# Altium footprint library Библиотека посадочных мест.PcbLib: 128 footprints (part 2 of 8)
Each footprint in its own frame and in the unit in brackets; x right, y up, seen from the top. Pads: shape width x height; smd on the part's side, far side on the other; paste and mask are expansions set on the pad; w line width, h text height; cw(c..) or ccw(c..) is an arc to the next point about the centre after c.
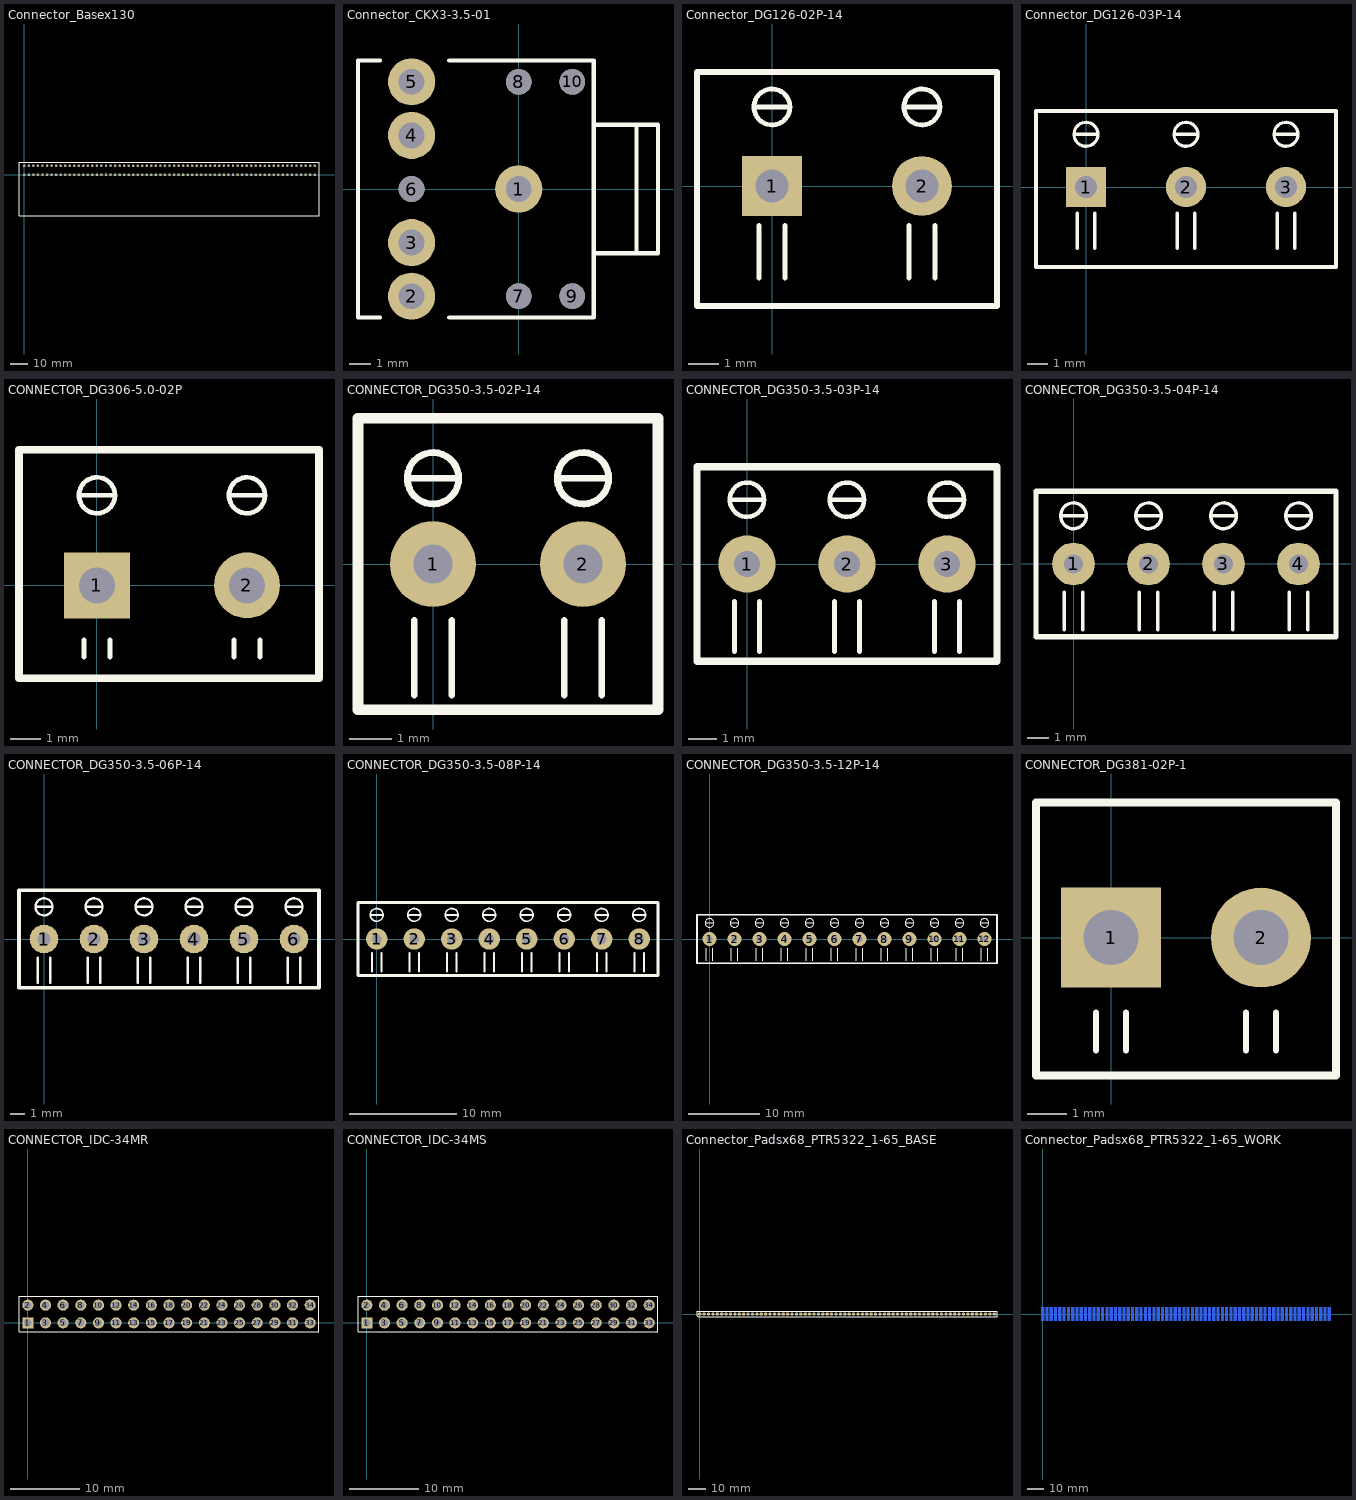
[diagram p1: the footprints below, top view; thin cyan lines are the x and y axes]

## Connector_Basex130 [mm]
pads (130):
  round 1.4 hole 0.9: 1(0,0) 2(2.54,0) 3(5.08,0) 4(7.62,0) 5(10.16,0) 6(12.7,0) 7(15.24,0) 8(17.78,0) 9(20.32,0) 10(22.86,0) 11(25.4,0) 12(27.94,0) 13(30.48,0) 14(33.02,0) 15(35.56,0) 16(38.1,0) 17(40.64,0) 18(43.18,0) 19(45.72,0) 20(48.26,0) 21(50.8,0) 22(53.34,0) 23(55.88,0) 24(58.42,0) 25(60.96,0) 26(63.5,0) 27(66.04,0) 28(68.58,0) 29(71.12,0) 30(73.66,0) 31(76.2,0) 32(78.74,0) 33(81.28,0) 34(83.82,0) 35(86.36,0) 36(88.9,0) 37(91.44,0) 38(93.98,0) 39(96.52,0) 40(99.06,0) 41(101.6,0) 42(104.14,0) 43(106.68,0) 44(109.22,0) 45(111.76,0) 46(114.3,0) 47(116.84,0) 48(119.38,0) 49(121.92,0) 50(124.46,0) 51(127,0) 52(129.54,0) 53(132.08,0) 54(134.62,0) 55(137.16,0) 56(139.7,0) 57(142.24,0) 58(144.78,0) 59(147.32,0) 60(149.86,0) 61(152.4,0) 62(154.94,0) 63(157.48,0) 64(160.02,0) 65(162.56,0) 66(0,5.08) 67(2.54,5.08) 68(5.08,5.08) 69(7.62,5.08) 70(10.16,5.08) 71(12.7,5.08) 72(15.24,5.08) 73(17.78,5.08) 74(20.32,5.08) 75(22.86,5.08) 76(25.4,5.08) 77(27.94,5.08) 78(30.48,5.08) 79(33.02,5.08) 80(35.56,5.08) 81(38.1,5.08) 82(40.64,5.08) 83(43.18,5.08) 84(45.72,5.08) 85(48.26,5.08) 86(50.8,5.08) 87(53.34,5.08) 88(55.88,5.08) 89(58.42,5.08) 90(60.96,5.08) 91(63.5,5.08) 92(66.04,5.08) 93(68.58,5.08) 94(71.12,5.08) 95(73.66,5.08) 96(76.2,5.08) 97(78.74,5.08) 98(81.28,5.08) 99(83.82,5.08) 100(86.36,5.08) 101(88.9,5.08) 102(91.44,5.08) 103(93.98,5.08) 104(96.52,5.08) 105(99.06,5.08) 106(101.6,5.08) 107(104.14,5.08) 108(106.68,5.08) 109(109.22,5.08) 110(111.76,5.08) 111(114.3,5.08) 112(116.84,5.08) 113(119.38,5.08) 114(121.92,5.08) 115(124.46,5.08) 116(127,5.08) 117(129.54,5.08) 118(132.08,5.08) 119(134.62,5.08) 120(137.16,5.08) 121(139.7,5.08) 122(142.24,5.08) 123(144.78,5.08) 124(147.32,5.08) 125(149.86,5.08) 126(152.4,5.08) 127(154.94,5.08) 128(157.48,5.08) 129(160.02,5.08) 130(162.56,5.08)
Top Overlay:
  lines w0.254: -3,-23 165,-23 165,7 82,7 -2,7 -3,7 -3,-23
3D body "Разъем Lab-Volt.STEP": height 11, standoff 0, extent -13.67,-23.203 179.18,10.847

## Connector_CKX3-3.5-01 [mm] "Audio Jack 3.5mm"
pads (10):
  round 2.2 hole 1.2: 1(0,0) 2(-5,-5) 3(-5,-2.5) 4(-5,2.5) 5(-5,5)
  round 1.2 hole 1.2: 6(-5,0) 7(0,-5) 8(0,5) 9(2.5,-5) 10(2.5,5)
Top Overlay:
  lines w0.2: -6.477,-6 -7.5,-6 -7.5,6 -6.477,6 ; -3.238,-6 3.5,-6 3.5,6 -3.238,6 ; 3.5,-3 6.5,-3 6.5,3 3.5,3 ; 5.5,-3 5.5,3
3D body "ST-212.step": height 1.5, standoff -7.3, extent -7.572,-6 6.428,6

## Connector_DG126-02P-14 [mm]
pads (2):
  rect 2x2 hole 1.1: 1(0,0)
  round 2 hole 1.1: 2(5,0)
Top Overlay:
  circle w0.16: c5,2.635 r0.6
  circle w0.16: c0,2.635 r0.6
  lines w0.16: -0.6,2.635 0.6,2.635 ; -0.437,-3.063 -0.437,-1.312 ; 0.437,-3.063 0.437,-1.312 ; 4.4,2.635 5.6,2.635 ; 4.563,-3.063 4.563,-1.312 ; 5.437,-3.063 5.437,-1.312
  lines w0.2: -2.5,-4 7.5,-4 7.5,3.8 -2.5,3.8 -2.5,-4
3D body "User Library-DG126-5_0-02P.STEP": height 10.35, standoff -2.04, extent -2.625,-4 7.625,3.8

## Connector_DG126-03P-14 [mm]
pads (3):
  rect 2x2 hole 1.1: 1(0,0)
  round 2 hole 1.1: 2(5,0) 3(10,0)
Top Overlay:
  circle w0.16: c10,2.635 r0.6
  circle w0.16: c0,2.635 r0.6
  circle w0.16: c5,2.635 r0.6
  lines w0.16: -0.6,2.635 0.6,2.635 ; -0.437,-3.063 -0.437,-1.312 ; 0.437,-3.063 0.437,-1.312 ; 4.4,2.635 5.6,2.635 ; 4.563,-3.063 4.563,-1.312 ; 5.437,-3.063 5.437,-1.312 ; 9.4,2.635 10.6,2.635 ; 9.563,-3.063 9.563,-1.312 ; 10.438,-3.063 10.438,-1.312
  lines w0.2: -2.5,-4 -2.5,3.8 7.5,3.8 12.5,3.8 12.5,-4 -2.5,-4
3D body "User Library-DG126-5_0-03P.STEP": height 10.25, standoff -2.14, extent -2.625,-4 12.625,3.8

## CONNECTOR_DG306-5.0-02P [mm]
height 8.4
pads (2):
  rect 2.2x2.2 hole 1.2: 1(0,0)
  round 2.2 hole 1.2: 2(5,0)
Top Overlay:
  circle w0.16: c0,3 r0.6
  circle w0.16: c5,3 r0.6
  lines w0.16: -0.6,3 0.6,3 ; -0.437,-2.4 -0.437,-1.812 ; 0.437,-2.4 0.437,-1.812 ; 4.4,3 5.6,3 ; 4.563,-2.4 4.563,-1.812 ; 5.438,-2.4 5.438,-1.812
  lines w0.254: -2.6,-3.1 -2.6,4.52 7.4,4.52 7.4,-3.1 -2.6,-3.1
3D body "DG306-5_0-1.STEP": height 9.8, standoff -3.9, extent -2.5,-3.1 7.5,4.5

## CONNECTOR_DG350-3.5-02P-14 [mm]
height 8.4
pads (2):
  round 2 hole 0.9: 1(0,0) 2(3.5,0)
Top Overlay:
  circle w0.16: c3.5,2 r0.6
  circle w0.16: c0,2 r0.6
  lines w0.16: -0.6,2 0.6,2 ; -0.437,-3.063 -0.437,-1.312 ; 0.437,-3.063 0.437,-1.312 ; 2.9,2 4.1,2 ; 3.063,-3.063 3.063,-1.312 ; 3.938,-3.063 3.938,-1.312
  lines w0.254: -1.75,-3.4 5.25,-3.4 5.25,3.4 -1.75,3.4 -1.75,-3.4
3D body "User Library-DG350-3_5-02P.STEP": height 8.4, standoff -3.4, extent -2.247,-3.4 5.753,3.4

## CONNECTOR_DG350-3.5-03P-14 [mm]
pads (3):
  round 2 hole 0.9: 1(0,0) 2(3.5,0) 3(7,0)
Top Overlay:
  circle w0.16: c3.5,2.25 r0.6
  circle w0.16: c7,2.25 r0.6
  circle w0.16: c0,2.25 r0.6
  circle w0.16: c3.5,2.25 r0.6
  lines w0.16: -0.6,2.25 0.6,2.25 ; -0.437,-3.063 -0.437,-1.312 ; 0.437,-3.063 0.437,-1.312 ; 6.4,2.25 7.6,2.25 ; 6.563,-3.063 6.563,-1.312 ; 7.438,-3.063 7.438,-1.312 ; 2.9,2.25 4.1,2.25 2.9,2.25 ; 3.063,-3.063 3.063,-1.312 3.063,-3.063 ; 3.938,-3.063 3.938,-1.312 3.938,-3.063
  lines w0.254: 1.75,-3.4 8.75,-3.4 8.75,3.4 1.75,3.4 ; 5.25,-3.4 -1.75,-3.4 -1.75,3.4 5.25,3.4

## CONNECTOR_DG350-3.5-04P-14 [mm]
pads (4):
  round 2 hole 0.9: 1(0,0) 2(3.5,0) 3(7,0) 4(10.5,0)
Top Overlay:
  circle w0.16: c7,2.25 r0.6
  circle w0.16: c10.5,2.25 r0.6
  circle w0.16: c0,2.25 r0.6
  circle w0.16: c3.5,2.25 r0.6
  lines w0.16: -0.6,2.25 0.6,2.25 ; -0.437,-3.063 -0.437,-1.312 ; 0.437,-3.063 0.437,-1.312 ; 2.9,2.25 4.1,2.25 ; 3.063,-3.063 3.063,-1.312 ; 3.938,-3.063 3.938,-1.312 ; 6.4,2.25 7.6,2.25 ; 6.563,-3.063 6.563,-1.312 ; 7.438,-3.063 7.438,-1.312 ; 9.9,2.25 11.1,2.25 ; 10.063,-3.063 10.063,-1.312 ; 10.938,-3.063 10.938,-1.312
  lines w0.254: -1.75,-3.4 -1.75,3.4 5.25,3.4 12.25,3.4 12.25,-3.4 5.25,-3.4 -1.75,-3.4
3D body "User Library-KLS2-340-3_81-1.STEP": height 8.4, standoff -3.27, extent 4.285,-3.5 12.905,3.5
3D body "User Library-KLS2-340-3_81-1.STEP": height 8.4, standoff -3.27, extent -2.715,-3.5 5.905,3.5

## CONNECTOR_DG350-3.5-06P-14 [mm]
pads (6):
  round 2 hole 0.9: 1(0,0) 2(3.5,0) 3(7,0) 4(10.5,0) 5(14,0) 6(17.5,0)
Top Overlay:
  circle w0.16: c7,2.25 r0.6
  circle w0.16: c10.5,2.25 r0.6
  circle w0.16: c0,2.25 r0.6
  circle w0.16: c3.5,2.25 r0.6
  circle w0.16: c17.5,2.25 r0.6
  circle w0.16: c14,2.25 r0.6
  lines w0.16: -0.6,2.25 0.6,2.25 ; -0.437,-3.063 -0.437,-1.312 ; 0.437,-3.063 0.437,-1.312 ; 2.9,2.25 4.1,2.25 ; 3.063,-3.063 3.063,-1.312 ; 3.938,-3.063 3.938,-1.312 ; 6.4,2.25 7.6,2.25 ; 6.563,-3.063 6.563,-1.312 ; 7.438,-3.063 7.438,-1.312 ; 9.9,2.25 11.1,2.25 ; 10.063,-3.063 10.063,-1.312 ; 10.938,-3.063 10.938,-1.312 ; 13.4,2.25 14.6,2.25 ; 13.563,-3.063 13.563,-1.312 ; 14.438,-3.063 14.438,-1.312 ; 16.9,2.25 18.1,2.25 ; 17.063,-3.063 17.063,-1.312 ; 17.938,-3.063 17.938,-1.312
  lines w0.254: -1.75,-3.4 -1.75,3.4 5.25,3.4 12.25,3.4 19.25,3.4 19.25,-3.4 12.25,-3.4 5.25,-3.4 -1.75,-3.4

## CONNECTOR_DG350-3.5-08P-14 [mm]
pads (8):
  round 2 hole 0.9: 1(0,0) 2(3.5,0) 3(7,0) 4(10.5,0) 5(14,0) 6(17.5,0) 7(21,0) 8(24.5,0)
Top Overlay:
  circle w0.16: c17.5,2.25 r0.6
  circle w0.16: c14,2.25 r0.6
  circle w0.16: c24.5,2.25 r0.6
  circle w0.16: c21,2.25 r0.6
  circle w0.16: c3.5,2.25 r0.6
  circle w0.16: c0,2.25 r0.6
  circle w0.16: c10.5,2.25 r0.6
  circle w0.16: c7,2.25 r0.6
  lines w0.16: -0.6,2.25 0.6,2.25 ; -0.437,-3.063 -0.437,-1.312 ; 0.437,-3.063 0.437,-1.312 ; 2.9,2.25 4.1,2.25 ; 3.063,-3.063 3.063,-1.312 ; 3.938,-3.063 3.938,-1.312 ; 6.4,2.25 7.6,2.25 ; 6.563,-3.063 6.563,-1.312 ; 7.438,-3.063 7.438,-1.312 ; 9.9,2.25 11.1,2.25 ; 10.063,-3.063 10.063,-1.312 ; 10.938,-3.063 10.938,-1.312 ; 13.4,2.25 14.6,2.25 ; 13.563,-3.063 13.563,-1.312 ; 14.437,-3.063 14.437,-1.312 ; 16.9,2.25 18.1,2.25 ; 17.063,-3.063 17.063,-1.312 ; 17.938,-3.063 17.938,-1.312 ; 20.4,2.25 21.6,2.25 ; 20.563,-3.063 20.563,-1.312 ; 21.438,-3.063 21.438,-1.312 ; 23.9,2.25 25.1,2.25 ; 24.063,-3.063 24.063,-1.312 ; 24.938,-3.063 24.938,-1.312
  lines w0.254: -1.75,-3.4 5.25,-3.4 12.25,-3.4 19.25,-3.4 26.25,-3.4 26.25,3.4 19.25,3.4 12.25,3.4 5.25,3.4 -1.75,3.4 -1.75,-3.4

## CONNECTOR_DG350-3.5-12P-14 [mm]
pads (12):
  round 2 hole 0.9: 1(0,0) 2(3.5,0) 3(7,0) 4(10.5,0) 5(14,0) 6(17.5,0) 7(21,0) 8(24.5,0) 9(28,0) 10(31.5,0) 11(35,0) 12(38.5,0)
Top Overlay:
  circle w0.16: c14,2.25 r0.6
  circle w0.16: c17.5,2.25 r0.6
  circle w0.16: c3.5,2.25 r0.6
  circle w0.16: c0,2.25 r0.6
  circle w0.16: c10.5,2.25 r0.6
  circle w0.16: c7,2.25 r0.6
  circle w0.16: c28,2.25 r0.6
  circle w0.16: c31.5,2.25 r0.6
  circle w0.16: c21,2.25 r0.6
  circle w0.16: c24.5,2.25 r0.6
  circle w0.16: c38.5,2.25 r0.6
  circle w0.16: c35,2.25 r0.6
  lines w0.16: -0.6,2.25 0.6,2.25 ; -0.437,-3.063 -0.437,-1.312 ; 0.437,-3.063 0.437,-1.312 ; 2.9,2.25 4.1,2.25 ; 3.063,-3.063 3.063,-1.312 ; 3.938,-3.063 3.938,-1.312 ; 6.4,2.25 7.6,2.25 ; 6.563,-3.063 6.563,-1.312 ; 7.438,-3.063 7.438,-1.312 ; 9.9,2.25 11.1,2.25 ; 10.063,-3.063 10.063,-1.312 ; 10.938,-3.063 10.938,-1.312 ; 13.4,2.25 14.6,2.25 ; 13.563,-3.063 13.563,-1.312 ; 14.438,-3.063 14.438,-1.312 ; 16.9,2.25 18.1,2.25 ; 17.063,-3.063 17.063,-1.312 ; 17.938,-3.063 17.938,-1.312 ; 20.4,2.25 21.6,2.25 ; 20.563,-3.063 20.563,-1.312 ; 21.438,-3.063 21.438,-1.312 ; 23.9,2.25 25.1,2.25 ; 24.063,-3.063 24.063,-1.312 ; 24.938,-3.063 24.938,-1.312 ; 27.4,2.25 28.6,2.25 ; 27.563,-3.063 27.563,-1.312 ; 28.438,-3.063 28.438,-1.312 ; 30.9,2.25 32.1,2.25 ; 31.063,-3.063 31.063,-1.312 ; 31.938,-3.063 31.938,-1.312 ; 34.4,2.25 35.6,2.25 ; 34.563,-3.063 34.563,-1.312 ; 35.438,-3.063 35.438,-1.312 ; 37.9,2.25 39.1,2.25 ; 38.063,-3.063 38.063,-1.312 ; 38.938,-3.063 38.938,-1.312
  lines w0.254: -1.75,-3.4 5.25,-3.4 12.25,-3.4 19.25,-3.4 26.25,-3.4 33.25,-3.4 40.25,-3.4 40.25,3.4 33.25,3.4 26.25,3.4 19.25,3.4 12.25,3.4 5.25,3.4 -1.75,3.4 -1.75,-3.4

## CONNECTOR_DG381-02P-1 [mm]
pads (2):
  rect 2.54x2.54 hole 1.4: 1(0,0)
  round 2.54 hole 1.4: 2(3.81,0)
Top Overlay:
  lines w0.16: -0.381,-2.857 -0.381,-1.905 ; 0.381,-2.857 0.381,-1.905 ; 3.429,-2.857 3.429,-1.905 ; 4.191,-2.857 4.191,-1.905
  lines w0.203: -1.905,-3.5 -1.905,3.429 5.715,3.429 5.715,-3.5 -1.905,-3.5
3D body "User Library-KLS2-340-3_81-1.STEP": height 8.4, standoff -3.27, extent -2.405,-3.5 6.215,3.5

## CONNECTOR_IDC-34MR [mm]
pads (34):
  rect 1.6x1.6 hole 1.1: 1(0,0)
  round 1.6 hole 1.1: 2(0,2.54) 3(2.54,0) 4(2.54,2.54) 5(5.08,0) 6(5.08,2.54) 7(7.62,0) 8(7.62,2.54) 9(10.16,0) 10(10.16,2.54) 11(12.7,0) 12(12.7,2.54) 13(15.24,0) 14(15.24,2.54) 15(17.78,0) 16(17.78,2.54) 17(20.32,0) 18(20.32,2.54) 19(22.86,0) 20(22.86,2.54) 21(25.4,0) 22(25.4,2.54) 23(27.94,0) 24(27.94,2.54) 25(30.48,0) 26(30.48,2.54) 27(33.02,0) 28(33.02,2.54) 29(35.56,0) 30(35.56,2.54) 31(38.1,0) 32(38.1,2.54) 33(40.64,0) 34(40.64,2.54)
Top Overlay:
  lines w0.1: -1.27,-1.27 -1.27,1.27 -1.27,3.81 3.81,3.81 8.89,3.81 13.97,3.81 41.91,3.81 41.91,-1.27 13.97,-1.27 8.89,-1.27 3.81,-1.27 -1.27,-1.27
3D body "BH-34R.STEP": height 8.6, standoff -3.3, extent -5.08,-0.318 45.72,13.243

## CONNECTOR_IDC-34MS [mm]
pads (34):
  rect 1.6x1.6 hole 1.1: 1(0,0)
  round 1.6 hole 1.1: 2(0,2.54) 3(2.54,0) 4(2.54,2.54) 5(5.08,0) 6(5.08,2.54) 7(7.62,0) 8(7.62,2.54) 9(10.16,0) 10(10.16,2.54) 11(12.7,0) 12(12.7,2.54) 13(15.24,0) 14(15.24,2.54) 15(17.78,0) 16(17.78,2.54) 17(20.32,0) 18(20.32,2.54) 19(22.86,0) 20(22.86,2.54) 21(25.4,0) 22(25.4,2.54) 23(27.94,0) 24(27.94,2.54) 25(30.48,0) 26(30.48,2.54) 27(33.02,0) 28(33.02,2.54) 29(35.56,0) 30(35.56,2.54) 31(38.1,0) 32(38.1,2.54) 33(40.64,0) 34(40.64,2.54)
Top Overlay:
  lines w0.1: -1.27,-1.27 3.81,-1.27 8.89,-1.27 13.97,-1.27 41.91,-1.27 41.91,3.81 13.97,3.81 8.89,3.81 3.81,3.81 -1.27,3.81 -1.27,1.27 -1.27,-1.27
3D body "BH-34.STEP": height 8.9, standoff -3.5, extent -5.08,-3.025 45.72,5.975

## Connector_Padsx68_PTR5322_1-65_BASE [mm]
pads (68):
  round 1.9 smd: 1(2.54,0) 2(5.08,0) 3(7.62,0) 4(10.16,0) 5(12.7,0) 6(15.24,0) 7(17.78,0) 8(20.32,0) 9(22.86,0) 10(25.4,0) 11(27.94,0) 12(30.48,0) 13(33.02,0) 14(35.56,0) 15(38.1,0) 16(40.64,0) 17(43.18,0) 18(45.72,0) 19(48.26,0) 20(50.8,0) 21(53.34,0) 22(55.88,0) 23(58.42,0) 24(60.96,0) 25(63.5,0) 26(66.04,0) 27(68.58,0) 28(71.12,0) 29(73.66,0) 30(76.2,0) 31(78.74,0) 32(81.28,0) 33(83.82,0) 34(86.36,0) 35(88.9,0) 36(91.44,0) 37(93.98,0) 38(96.52,0) 39(99.06,0) 40(101.6,0) 41(104.14,0) 42(106.68,0) 43(109.22,0) 44(111.76,0) 45(114.3,0) 46(116.84,0) 47(119.38,0) 48(121.92,0) 49(124.46,0) 50(127,0) 51(129.54,0) 52(132.08,0) 53(134.62,0) 54(137.16,0) 55(139.7,0) 56(142.24,0) 57(144.78,0) 58(147.32,0) 59(149.86,0) 60(152.4,0) 61(154.94,0) 62(157.48,0) 63(160.02,0) 64(162.56,0) 65(165.1,0) NC(0,0) NC(167.64,0) NC(170.18,0)
Top Overlay:
  lines w0.254: -1.587,-0.953 -0.953,-1.587 171.767,-1.587 171.767,1.587 0.953,1.587 -1.587,1.587 -1.587,-0.318 -1.587,-0.953
3D body "FKB 5322_1-04-65 (4).STEP": height 6.5, standoff 0, extent -1.27,-1.27 8.89,1.27
3D body "FKB 5322_1-04-65 (4).STEP": height 6.5, standoff 0, extent 8.89,-1.27 19.05,1.27
3D body "FKB 5322_1-04-65 (4).STEP": height 6.5, standoff 0, extent 19.05,-1.27 29.21,1.27
3D body "FKB 5322_1-04-65 (4).STEP": height 6.5, standoff 0, extent 29.21,-1.27 39.37,1.27
3D body "FKB 5322_1-04-65 (4).STEP": height 6.5, standoff 0, extent 39.37,-1.27 49.53,1.27
3D body "FKB 5322_1-04-65 (4).STEP": height 6.5, standoff 0, extent 49.53,-1.27 59.69,1.27
3D body "FKB 5322_1-04-65 (4).STEP": height 6.5, standoff 0, extent 59.69,-1.27 69.85,1.27
3D body "FKB 5322_1-04-65 (4).STEP": height 6.5, standoff 0, extent 69.85,-1.27 80.01,1.27
3D body "FKB 5322_1-04-65 (4).STEP": height 6.5, standoff 0, extent 80.01,-1.27 90.17,1.27
3D body "FKB 5322_1-04-65 (4).STEP": height 6.5, standoff 0, extent 90.17,-1.27 100.33,1.27
3D body "FKB 5322_1-04-65 (4).STEP": height 6.5, standoff 0, extent 100.33,-1.27 110.49,1.27
3D body "FKB 5322_1-04-65 (4).STEP": height 6.5, standoff 0, extent 110.49,-1.27 120.65,1.27
3D body "FKB 5322_1-04-65 (4).STEP": height 6.5, standoff 0, extent 120.65,-1.27 130.81,1.27
3D body "FKB 5322_1-04-65 (4).STEP": height 6.5, standoff 0, extent 130.81,-1.27 140.97,1.27
3D body "FKB 5322_1-04-65 (4).STEP": height 6.5, standoff 0, extent 140.97,-1.27 151.13,1.27
3D body "FKB 5322_1-04-65 (4).STEP": height 6.5, standoff 0, extent 151.13,-1.27 161.29,1.27
3D body "FKB 5322_1-04-65 (4).STEP": height 6.5, standoff 0, extent 161.29,-1.27 171.45,1.27

## Connector_Padsx68_PTR5322_1-65_WORK [mm]
pads (68):
  rect 1.6x8 smd far side: 1(2.54,0) 2(5.08,0) 3(7.62,0) 4(10.16,0) 5(12.7,0) 6(15.24,0) 7(17.78,0) 8(20.32,0) 9(22.86,0) 10(25.4,0) 11(27.94,0) 12(30.48,0) 13(33.02,0) 14(35.56,0) 15(38.1,0) 16(40.64,0) 17(43.18,0) 18(45.72,0) 19(48.26,0) 20(50.8,0) 21(53.34,0) 22(55.88,0) 23(58.42,0) 24(60.96,0) 25(63.5,0) 26(66.04,0) 27(68.58,0) 28(71.12,0) 29(73.66,0) 30(76.2,0) 31(78.74,0) 32(81.28,0) 33(83.82,0) 34(86.36,0) 35(88.9,0) 36(91.44,0) 37(93.98,0) 38(96.52,0) 39(99.06,0) 40(101.6,0) 41(104.14,0) 42(106.68,0) 43(109.22,0) 44(111.76,0) 45(114.3,0) 46(116.84,0) 47(119.38,0) 48(121.92,0) 49(124.46,0) 50(127,0) 51(129.54,0) 52(132.08,0) 53(134.62,0) 54(137.16,0) 55(139.7,0) 56(142.24,0) 57(144.78,0) 58(147.32,0) 59(149.86,0) 60(152.4,0) 61(154.94,0) 62(157.48,0) 63(160.02,0) 64(162.56,0) 65(165.1,0) NC(167.64,0) NC(170.18,0)
  rect 1.6x8 smd far side mask+0.102: NC(0,0)